# Altium footprint library PcbLib.PcbLib: 428 footprints (part 20 of 27)
Each footprint in its own frame and in the unit in brackets; x right, y up, seen from the top. Pads: shape width x height; smd on the part's side, far side on the other; paste and mask are expansions set on the pad; w line width, h text height; cw(c..) or ccw(c..) is an arc to the next point about the centre after c.
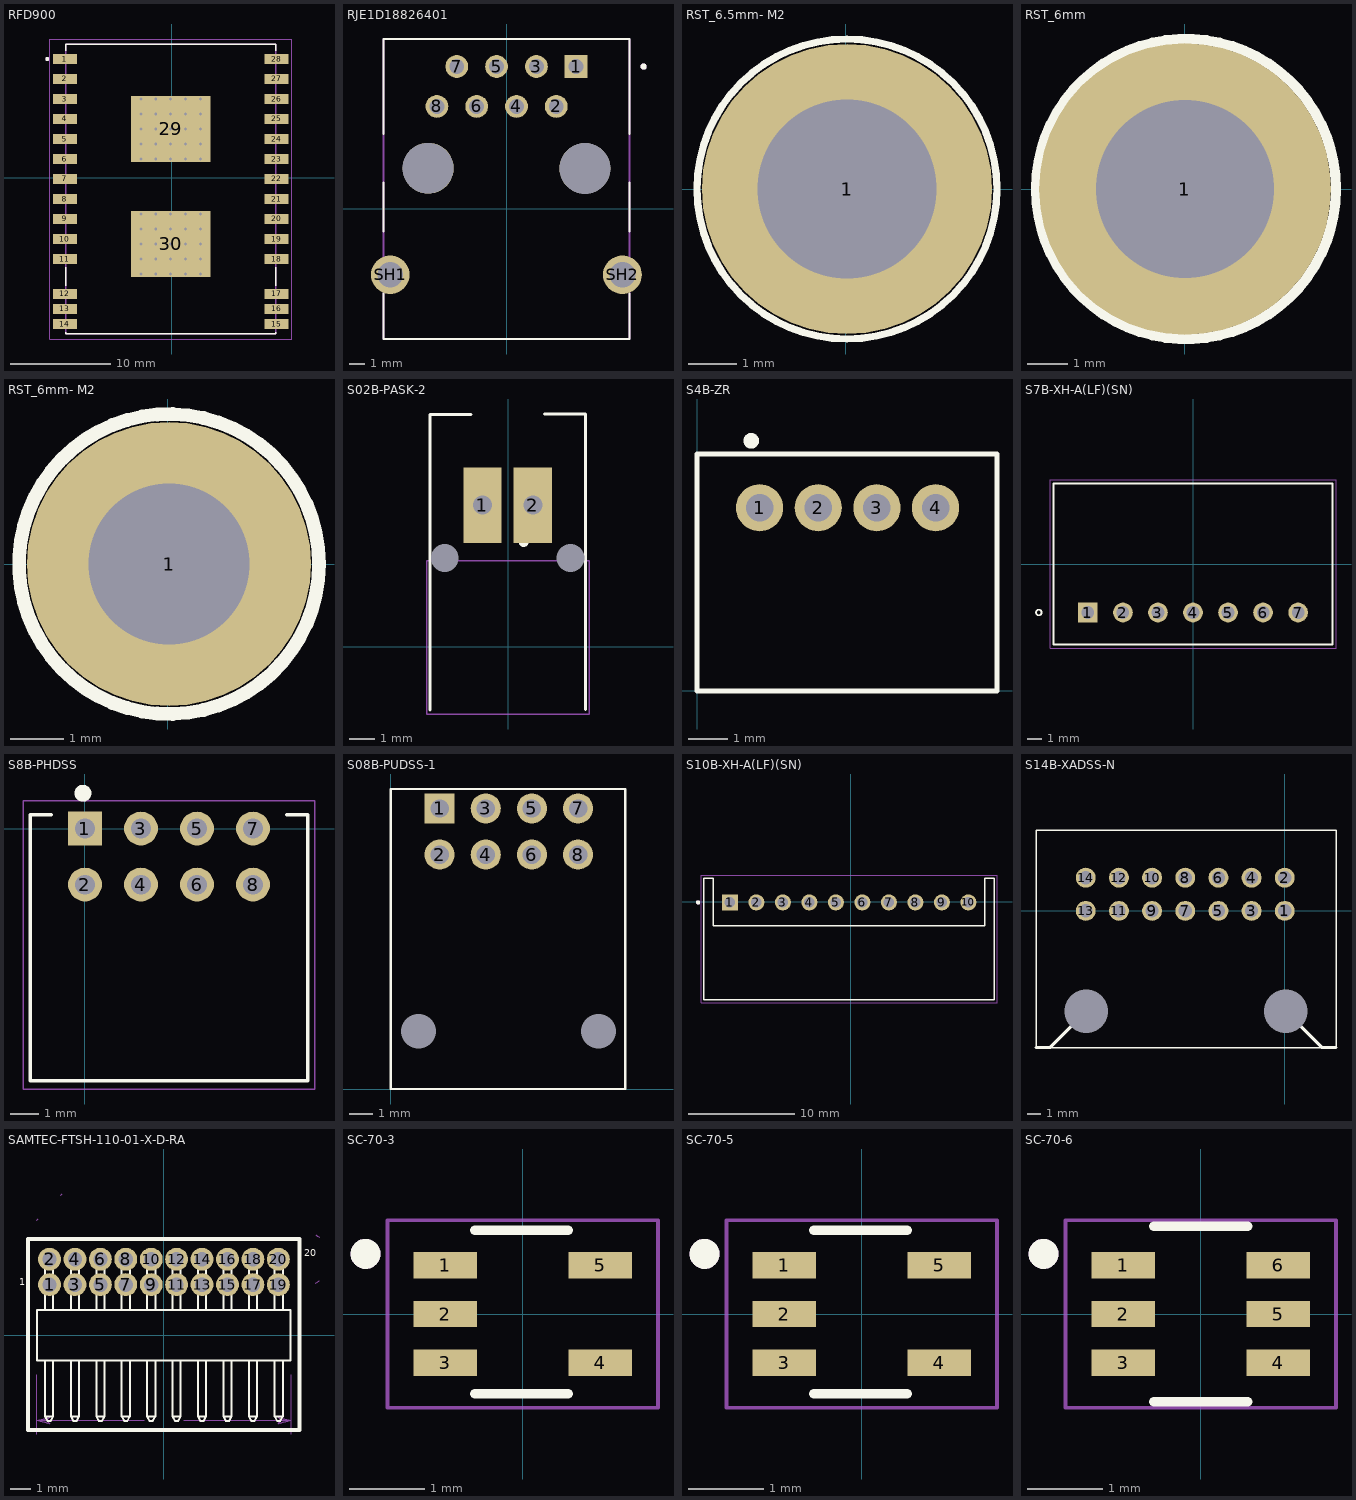
[diagram p19: the footprints below, top view; thin cyan lines are the x and y axes]

## RFD900 [mm]
pads (80):
  rect 2.4x1 smd: 1(-10.676,11.882) 2(-10.676,9.882) 3(-10.676,7.882) 4(-10.676,5.882) 5(-10.676,3.882) 6(-10.676,1.882) 7(-10.676,-0.118) 8(-10.676,-2.118) 9(-10.676,-4.118) 10(-10.676,-6.118) 11(-10.676,-8.118) 12(-10.676,-11.618) 13(-10.676,-13.118) 14(-10.676,-14.618) 15(10.524,-14.618) 16(10.524,-13.118) 17(10.524,-11.618) 18(10.524,-8.118) 19(10.524,-6.118) 20(10.524,-4.118) 21(10.524,-2.118) 22(10.524,-0.118) 23(10.524,1.882) 24(10.524,3.882) 25(10.524,5.882) 26(10.524,7.882) 27(10.524,9.882) 28(10.524,11.882)
  rect 8x6.6 smd paste-5: 29(-0.076,4.882) 30(-0.076,-6.618)
  round 0.5 hole 0.3 mask+0: 31(-3.076,7.882) 32(-1.576,7.882) 33(-0.076,7.882) 34(1.424,7.882) 35(2.924,7.882) 36(-3.076,6.382) 37(-1.576,6.382) 38(-0.076,6.382) 39(1.424,6.382) 40(2.924,6.382) 41(-3.076,4.882) 42(-1.576,4.882) 43(-0.076,4.882) 44(1.424,4.882) 45(2.924,4.882) 46(-3.076,3.382) 47(-1.576,3.382) 48(-0.076,3.382) 49(1.424,3.382) 50(2.924,3.382) 51(-3.076,1.882) 52(-1.576,1.882) 53(-0.076,1.882) 54(1.424,1.882) 55(2.924,1.882) 56(-3.076,-3.618) 57(-1.576,-3.618) 58(-0.076,-3.618) 59(1.424,-3.618) 60(2.924,-3.618) 61(-3.076,-5.118) 62(-1.576,-5.118) 63(-0.076,-5.118) 64(1.424,-5.118) 65(2.924,-5.118) 66(-3.076,-6.618) 67(-1.576,-6.618) 68(-0.076,-6.618) 69(1.424,-6.618) 70(2.924,-6.618) 71(-3.076,-8.118) 72(-1.576,-8.118) 73(-0.076,-8.118) 74(1.424,-8.118) 75(2.924,-8.118) 76(-3.076,-9.618) 77(-1.576,-9.618) 78(-0.076,-9.618) 79(1.424,-9.618) 80(2.924,-9.618)
Top Overlay:
  circle w0.2: c-12.426,11.882 r0.1
  lines w0.127: -10.576,-15.438 -10.576,-15.618 10.424,-15.618 10.424,-15.438 ; -10.576,-10.798 -10.576,-8.938 ; -10.576,12.702 -10.576,13.382 10.424,13.382 10.424,12.702 ; 10.424,-10.798 10.424,-8.938
Top Paste:
  region: -0.326,-9.618 -3.576,-9.618 -3.576,-6.868 -0.326,-6.868
  region: 3.424,-6.368 0.174,-6.368 0.174,-3.618 3.424,-3.618
  region: 3.424,-9.618 0.174,-9.618 0.174,-6.868 3.424,-6.868
  region: -0.326,-6.368 -3.576,-6.368 -3.576,-3.618 -0.326,-3.618
  region: -0.326,1.882 -3.576,1.882 -3.576,4.632 -0.326,4.632
  region: 3.424,5.132 0.174,5.132 0.174,7.882 3.424,7.882
  region: 3.424,1.882 0.174,1.882 0.174,4.632 3.424,4.632
  region: -0.326,5.132 -3.576,5.132 -3.576,7.882 -0.326,7.882
Mechanical 13:
  circle w0.2: c-12.426,11.882 r0.1
  lines w0.127: -10.576,-15.618 -10.576,13.382 10.424,13.382 10.424,-15.618 -10.576,-15.618
Mechanical 15:
  lines w0.05: -12.176,-16.118 12.024,-16.118 12.024,13.882 -12.176,13.882 -12.176,-16.118
3D body "step_temp.STEP": height 4.2, standoff 0, extent -10.576,-15.618 10.424,13.382

## RJE1D18826401 [mm]
pads (12):
  rect 1.458x1.458 / inner round 1.458 / far side rect 1.458x1.458 hole 0.95: 1(4.44,9.088)
  round 1.458 hole 0.95: 2(3.17,6.548) 3(1.9,9.088) 4(0.63,6.548) 5(-0.64,9.088) 6(-1.91,6.548) 7(-3.18,9.088) 8(-4.45,6.548)
  round 2.475 hole 1.65: SH1(-7.43,-4.202) SH2(7.395,-4.202)
  round 3.25 hole 3.25 unplated: ""(-5.005,2.598) ""(4.995,2.588)
Top Overlay:
  circle w0.2: c8.745,9.088 r0.1
  lines w0.127: -7.855,-5.402 -7.855,-8.302 7.845,-8.302 7.845,-5.402 ; -7.855,-1.452 -7.855,1.697 ; -7.855,4.799 -7.855,10.848 7.845,10.848 7.845,4.799 ; 7.845,-1.452 7.845,1.697
Mechanical 13:
  circle w0.2: c8.745,9.088 r0.1
  lines w0.127: -7.855,-8.302 -7.855,10.848 7.845,10.848 7.845,-8.302 -7.855,-8.302
3D body "RJE1D18826401--3DModel-STEP-533217.STEP": height 13.58, standoff -2.77, extent -7.684,-9.566 7.598,11.314

## RST_6.5mm- M2 [mm]
pads (1):
  round 6 / inner round 5.3 / far side round 4 hole 3.7: 1(0.025,0)
Top Overlay:
  circle w0.15: c0.025,0 r3.1
3D body "Download_STEP_9774065151_rev1.stp": height 6.65, standoff -1.25, extent -2.53,-2.54 2.57,2.56

## RST_6mm [mm]
pads (1):
  round 7.2 / inner round 7.2 / far side round 0.1 hole 4.4: 1(0,0)
Top Overlay:
  circle w0.254: c0.025,0 r3.7
3D body "Download_STP_9774060360R_rev1.stp": height 6.25, standoff -1.15, extent -2.946,-3 3.048,2.988

## RST_6mm- M2 [mm]
pads (1):
  round 5.3 / inner round 5.3 / far side round 3.5 hole 3: 1(0.025,0)
Top Overlay:
  circle w0.254: c0.025,0 r2.8
3D body "Download_STP_9774060243R_rev1.stp": height 6.2, standoff -1.2, extent -2.138,-2.175 2.188,2.175

## S02B-PASK-2 [mil]
pads (4):
  round 0 hole 43.31: 1(-99,139) 1(98,139)
  rect 60x118.11 hole 29.53: 1(-40,222) 2(39,222)
Top Overlay:
  circle w7.87: c24.61,164.37 r3.94
  lines w5: -122.19,-99 -122.19,363.66 -58.02,363.66 ; 57.02,364.66 121.19,364.66 121.19,-98
Mechanical 15:
  lines w1.97: -126.97,-105.31 126.97,-105.31 126.97,134.84 -126.97,134.84 -126.97,-105.31
3D body "S02B-PASK-2.STEP": height 263.78, standoff -125.98, extent -118.22,-100.31 118,360.31

## S4B-ZR [mm]
pads (4):
  round 1.208 hole 0.7: 1(1.593,4.678) 2(3.093,4.678) 3(4.593,4.678) 4(6.093,4.678)
Top Overlay:
  circle w0.2: c1.38,6.39 r0.1
  lines w0.127: -0.007,-0.01 -0.007,6.05 7.664,6.05 7.664,-0.01 -0.007,-0.01
3D body "S4B-ZR.STEP": height 3.8, standoff -2.6, extent 0.07,0.07 7.57,6.07

## S7B-XH-A(LF)(SN) [mm]
pads (7):
  rect 1.408x1.408 hole 0.9: 1(-7.5,-3.46)
  round 1.408 hole 0.9: 2(-5,-3.46) 3(-2.5,-3.46) 4(0,-3.46) 5(2.5,-3.46) 6(5,-3.46) 7(7.5,-3.46)
Top Overlay:
  circle w0.127: c-11,-3.46 r0.2
  lines w0.127: -9.95,-5.75 9.95,-5.75 9.95,5.75 -9.95,5.75 -9.95,-1.25 -9.95,-1.27 -9.95,-5.75
Mechanical 15:
  lines w0.05: -10.2,-6 10.2,-6 10.2,6 -10.2,6 -10.2,-6
3D body "S7B-XH-A(LF)(SN)--3DModel-STEP-56544.STEP": height 6.15, standoff -3.4, extent -9.95,-5.75 9.95,5.75

## S8B-PHDSS [mm]
pads (8):
  rect 1.208x1.208 hole 0.7: 1(0,0)
  round 1.208 hole 0.7: 2(0,-2) 3(2,0) 4(2,-2) 5(4,0) 6(4,-2) 7(6,0) 8(6,-2)
Top Overlay:
  circle w0.3: c-0.074,1.262 r0.15
  lines w0.127: -1.2,0.5 -1.95,0.5 -1.95,-9 7.95,-9 7.95,0.5 7.2,0.5
Mechanical 15:
  lines w0.05: -2.2,-9.3 -2.2,1 8.2,1 8.2,-9.3 -2.2,-9.3
3D body "S8B-PHDSS.STEP": height 5, standoff -3, extent -1.95,-9 7.95,0.5

## S08B-PUDSS-1 [mm]
pads (10):
  rect 1.308x1.308 hole 0.8: 1(2.115,12.156)
  round 1.308 hole 0.8: 2(2.115,10.156) 3(4.115,12.156) 4(4.115,10.156) 5(6.115,12.156) 6(6.115,10.156) 7(8.115,12.156) 8(8.115,10.156)
  round 0 hole 1.5 unplated: ""(1.2,2.5) ""(9,2.5)
Top Overlay:
  lines w0.1: 0,0 0,13 10.16,13 10.16,0 0,0
3D body "S08B-PUDSS-1.STEP": height 8.5, standoff -3, extent 0.1,0.05 10.1,12.75

## S10B-XH-A(LF)(SN) [mm]
pads (10):
  rect 1.508x1.508 / inner round 1.508 / far side rect 1.508x1.508 hole 1: 1(-11.394,-0.048)
  round 1.508 hole 1: 2(-8.894,-0.048) 3(-6.394,-0.048) 4(-3.894,-0.048) 5(-1.394,-0.048) 6(1.106,-0.048) 7(3.606,-0.048) 8(6.106,-0.048) 9(8.606,-0.048) 10(11.106,-0.048)
Top Overlay:
  circle w0.2: c-14.394,-0.048 r0.1
  lines w0.127: -13.844,-9.248 13.556,-9.248 13.556,2.252 12.656,2.252 12.656,-2.248 -12.944,-2.248 -12.944,2.252 -13.844,2.252 -13.844,-9.248
Mechanical 13:
  circle w0.2: c-14.394,-0.048 r0.1
Mechanical 15:
  lines w0.05: -14.094,-9.498 -14.094,2.502 13.806,2.502 13.806,-9.498 -14.094,-9.498
3D body "step_temp.STEP": height 6.1, standoff -3.4, extent -13.844,-9.248 13.556,2.252

## S14B-XADSS-N [mm]
pads (16):
  round 1.5 hole 1: 1(0,0) 2(0,2.5) 3(-2.5,0) 4(-2.5,2.5) 5(-5,0) 6(-5,2.5) 7(-7.5,0) 8(-7.5,2.5) 9(-10,0) 10(-10,2.5) 11(-12.5,0) 12(-12.5,2.5) 13(-15,0) 14(-15,2.5)
  round 0.6 hole 3.3 unplated: ""(-14.97,-7.57) ""(0.08,-7.57)
Top Overlay:
  lines w0.1: -18.75,-10.3 -18.75,6.06 3.86,6.06 3.86,-10.3 -18.75,-10.3
  lines w0.254: -18.75,-10.3 -17.7,-10.3 -14.97,-7.57 ; 0.08,-7.57 2.81,-10.3 3.86,-10.3
3D body "S14B-XADSS-N.STEP": height 12.25, standoff -3.35, extent -18.7,-10.25 3.8,5.95

## SAMTEC-FTSH-110-01-X-D-RA [mil]
pads (20):
  round 45 hole 27.95: 1(-225,99.49) 2(-225,149.49) 3(-175,99.49) 4(-175,149.49) 5(-125,99.49) 6(-125,149.49) 7(-75,99.49) 8(-75,149.49) 9(-25,99.49) 10(-25,149.49) 11(25,99.49) 12(25,149.49) 13(75,99.49) 14(75,149.49) 15(125,99.49) 16(125,149.49) 17(175,99.49) 18(175,149.49) 19(225,99.49) 20(225,149.49)
Top Overlay:
  lines w3.94: -233.7,-49.49 -233.7,-160 ; -233.7,49.49 -233.7,157.99 -217.72,157.99 -217.72,49.49 ; -217.72,-49.49 -217.72,-160 ; -200.71,-49.49 -249.21,-49.49 -249.21,49.49 -200.71,49.49 ; -200,-49.49 -150,-49.49 -100,-49.49 -50,-49.49 0,-49.49 50,-49.49 100,-49.49 150,-49.49 200,-49.49 ; -200,49.49 -150,49.49 -100,49.49 -50,49.49 0,49.49 50,49.49 100,49.49 150,49.49 200,49.49 ; -182.99,-49.49 -182.99,-160 ; -182.99,49.49 -182.99,157.99 -167.01,157.99 -167.01,49.49 ; -167.01,-49.49 -167.01,-160 ; -132.99,-49.49 -132.99,-160 ; -132.99,49.49 -132.99,157.99 -117.01,157.99 -117.01,49.49 ; -117.01,-49.49 -117.01,-160 ; -82.99,-49.49 -82.99,-160 ; -82.99,49.49 -82.99,157.99 -67.01,157.99 -67.01,49.49 ; -67.01,-49.49 -67.01,-160 ; -32.99,-49.49 -32.99,-160 ; -32.99,49.49 -32.99,157.99 -17.01,157.99 -17.01,49.49 ; -17.01,-49.49 -17.01,-160 ; 17.01,-49.49 17.01,-160 ; 17.01,49.49 17.01,157.99 32.99,157.99 32.99,49.49 ; 32.99,-49.49 32.99,-160 ; 67.01,-49.49 67.01,-160 ; 67.01,49.49 67.01,157.99 82.99,157.99 82.99,49.49 ; 82.99,-49.49 82.99,-160 ; 117.01,-49.49 117.01,-160 ; 117.01,49.49 117.01,157.99 132.99,157.99 132.99,49.49 ; 132.99,-49.49 132.99,-160 ; 167.01,-49.49 167.01,-160 ; 167.01,49.49 167.01,157.99 182.99,157.99 182.99,49.49 ; 182.99,-49.49 182.99,-160 ; 200.79,-49.49 249.29,-49.49 249.29,49.49 200.79,49.49 ; 217.8,-49.49 217.8,-160 ; 217.8,49.49 217.8,157.99 233.82,157.99 233.82,49.49 ; 233.82,-49.49 233.82,-160 ; -233.7,-160 -217.72,-160 ; -233.7,-160 -228.5,-169.02 -222.91,-169.02 -217.72,-160 ; -182.99,-160 -167.01,-160 ; -182.99,-160 -177.8,-169.02 -172.2,-169.02 -167.01,-160 ; -132.99,-160 -117.01,-160 ; -132.99,-160 -127.8,-169.02 -122.2,-169.02 -117.01,-160 ; -82.99,-160 -67.01,-160 ; -82.99,-160 -77.8,-169.02 -72.2,-169.02 -67.01,-160 ; -32.99,-160 -17.01,-160 ; -32.99,-160 -27.8,-169.02 -22.2,-169.02 -17.01,-160 ; 17.01,-160 32.99,-160 ; 17.01,-160 22.2,-169.02 27.8,-169.02 32.99,-160 ; 67.01,-160 82.99,-160 ; 67.01,-160 72.2,-169.02 77.8,-169.02 82.99,-160 ; 117.01,-160 132.99,-160 ; 117.01,-160 122.2,-169.02 127.8,-169.02 132.99,-160 ; 167.01,-160 182.99,-160 ; 167.01,-160 172.2,-169.02 177.8,-169.02 182.99,-160 ; 217.8,-160 233.82,-160 ; 217.8,-160 222.99,-169.02 228.58,-169.02 233.82,-160
  lines w7.87: -266.93,-186.73 267.01,-186.73 267.01,189.76 -266.93,189.76 -266.93,-186.73
  text "1" at -285,93 h23.62
  text "20" at 276,150 h23.62
Mechanical 40:
  lines w0: -250,-195.12 -250,-77.6 ; -250,226.26 -247.48,229.37 ; -202.52,275.63 -200,278.74 ; -39.02,-167.48 -250,-167.48 ; 39.02,-167.48 250,-167.48 ; 250,-195.12 250,-77.6 ; 298.74,102.52 305,107.48 301.89,105 ; 301.89,195 298.74,197.48 305,192.52 ; -250,-167.48 -227.48,-164.37 -225,-161.26 ; -250,-167.48 -230,-167.48 ; -250,-167.48 -227.48,-170.63 -230,-167.48 ; -250,-167.48 -225,-173.74 -230,-167.48 ; -250,-167.48 -225,-161.26 ; -230,-167.48 -225,-161.26 ; 225,-173.74 227.48,-170.63 250,-167.48 ; 225,-173.74 230,-167.48 ; 225,-173.74 250,-167.48 ; 230,-167.48 250,-167.48 ; 230,-167.48 227.48,-164.37 250,-167.48 ; 230,-167.48 225,-161.26 250,-167.48
  text "12.700" at -31.5,-172.52 h15.5

## SC-70-3 [mm]
pads (5):
  rect 0.85x0.35 smd: 1(-1.036,0.65) 2(-1.036,0) 3(-1.036,-0.65) 4(1.036,-0.65) 5(1.036,0.65)
Top Overlay:
  circle w0.2: c-2.1,0.802 r0.1
  lines w0.127: -0.64,-1.067 0.61,-1.067 ; -0.64,1.118 0.61,1.118
Mechanical 13:
  circle w0.2: c-2.1,0.802 r0.1
Mechanical 15:
  lines w0.05: -1.805,-1.25 1.805,-1.25 1.805,1.25 -1.805,1.25 -1.805,-1.25
3D body "NC7SZU04.STEP": height 1.1, standoff 0, extent -1.075,-0.991 1.025,1.009

## SC-70-5 [mm]
pads (5):
  rect 0.85x0.35 smd: 1(-1.036,0.65) 2(-1.036,0) 3(-1.036,-0.65) 4(1.036,-0.65) 5(1.036,0.65)
Top Overlay:
  circle w0.2: c-2.1,0.802 r0.1
  lines w0.127: -0.64,-1.067 0.61,-1.067 ; -0.64,1.118 0.61,1.118
Mechanical 13:
  circle w0.2: c-2.1,0.802 r0.1
Mechanical 15:
  lines w0.05: -1.805,-1.25 -1.805,1.25 1.805,1.25 1.805,-1.25 -1.805,-1.25
3D body "NC7SZU04.STEP": height 1.1, standoff 0, extent -1.075,-0.991 1.025,1.009

## SC-70-6 [mm]
pads (6):
  rect 0.85x0.35 smd: 1(-1.036,0.65) 2(-1.036,0) 3(-1.036,-0.65) 4(1.036,-0.65) 5(1.036,0) 6(1.036,0.65)
Top Overlay:
  circle w0.2: c-2.1,0.802 r0.1
  lines w0.127: -0.625,-1.17 0.625,-1.17 ; -0.625,1.17 0.625,1.17
Mechanical 13:
  circle w0.2: c-2.1,0.802 r0.1
Mechanical 15:
  lines w0.05: -1.805,-1.25 -1.805,1.25 1.805,1.25 1.805,-1.25 -1.805,-1.25
3D body "SN74LVC1T45DCKR--3DModel-STEP-1.STEP": height 1.1, standoff 0, extent -1.05,-1.016 1.05,0.984